# Altium footprint library TH Connectors.PcbLib: 140 footprints (part 3 of 9)
Each footprint in its own frame and in the unit in brackets; x right, y up, seen from the top. Pads: shape width x height; smd on the part's side, far side on the other; paste and mask are expansions set on the pad; w line width, h text height; cw(c..) or ccw(c..) is an arc to the next point about the centre after c.
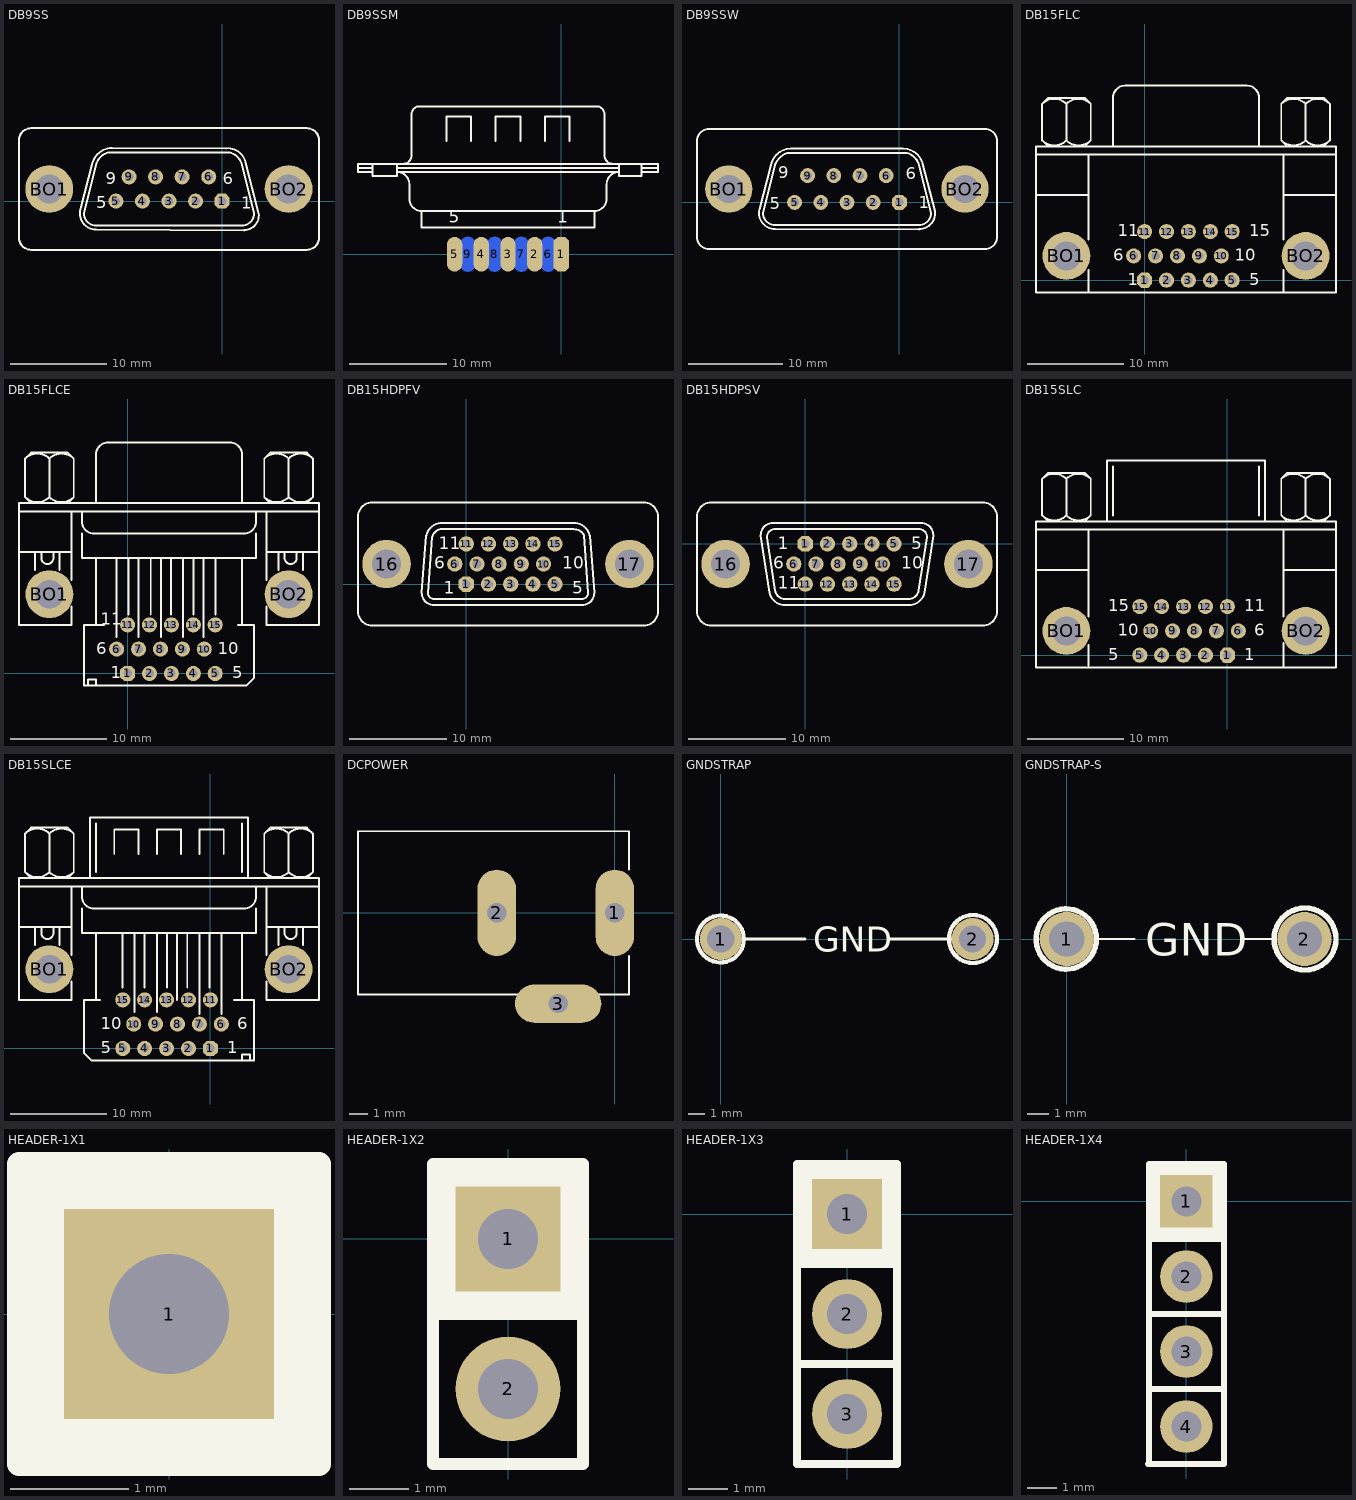
[diagram p2: the footprints below, top view; thin cyan lines are the x and y axes]

## DB9SS [mil]
pads (11):
  oct 62x62 hole 35: 1(0,0)
  round 62 hole 35: 2(-109.17,0) 3(-218.33,0) 4(-327.5,0) 5(-436.67,0) 6(-55,100) 7(-164.17,100) 8(-273.33,100) 9(-382.5,100)
  round 196.67 hole 118.33: BO1(-710.83,50) BO2(273.33,50)
Top Overlay:
  lines w8: -580,-23.33 -535,150 ; -579.7,-23.95 ccw(c-518.33,-50) -518.33,-116.67 90,-120 ; -535.1,149.55 cw(c-451.67,133.33) -451.67,218.33 15,216.67 ; -518.33,150 -568.33,-50 ccw(c-518.33,-50) -518.33,-100 81.67,-100 ccw(c81.67,-50) 131.67,-50 81.67,150 ; -517.97,149.86 cw(c-451.67,133.33) -468.2,199.64 ; -468.33,200 31.67,200 ; 15.41,217.08 cw(c23.33,141.67) 97.22,158.72 ; 31.53,199.64 cw(c15,133.33) 81.3,149.86 ; 90,-119.17 ccw(c90,-58.33) 148.48,-41.57 ; 96.67,158.33 148.33,-41.67 ; -835,-150 ccw(c-785,-150) -785,-200 348.33,-200 ccw(c348.33,-150) 398.33,-150 398.33,250 ccw(c348.33,250) 348.33,300 -785,300 ccw(c-785,250) -835,250 -835,-150
  text "6" at 1.67,70 h50
  text "1" at 78.27,-31.3 h50
  text "5" at -518.33,-30 h50
  text "9" at -478.33,70 h50

## DB9SSM [mil]
pads (9):
  oct 62.5x141.67 smd: 1(0,0)
  oval 62.5x141.67 smd: 2(-108.33,0) 3(-216.67,0) 4(-325,0) 5(-433.33,0)
  oval 62.5x141.67 smd far side: 6(-54.17,0) 7(-162.5,0) 8(-270.83,0) 9(-379.17,0)
Top Overlay:
  lines w8: -825,350 -766.67,350 ; -766.67,333.33 -825,333.33 -825,366.67 391.67,366.67 391.67,333.33 325,333.33 ; -766.67,366.67 -766.67,316.67 -666.67,316.67 -666.67,366.67 ; -666.67,350 233.33,350 ; -641.67,366.67 ccw(c-641.67,400) -608.33,400 -608.33,566.67 cw(c-575,566.67) -575,600 141.67,600 cw(c141.67,566.67) 175,566.67 175,400 ccw(c208.33,400) 208.33,366.67 ; -466.67,458.33 -466.67,558.33 -366.67,558.33 -366.67,458.33 ; -266.67,458.33 -266.67,558.33 -166.67,558.33 -166.67,458.33 ; -66.67,458.33 -66.67,558.33 33.33,558.33 33.33,458.33 ; 233.33,366.67 233.33,316.67 325,316.67 325,366.67 ; 325,350 391.67,350 ; -566.67,175 cw(c-566.67,225) -616.67,225 -616.67,283.33 ccw(c-666.67,283.33) -666.67,333.33 233.33,333.33 ccw(c233.33,283.33) 183.33,283.33 183.33,225 cw(c133.33,225) 133.33,175 ; -566.67,175 -566.67,108.33 133.33,108.33 133.33,175 ; -566.67,175 133.33,175
  text "5" at -456.67,128.33 h50
  text "1" at -16.67,128.33 h50

## DB9SSW [mil]
pads (11):
  oct 62x62 hole 35: 1(0,0)
  round 62 hole 35: 2(-109.17,0) 3(-218.33,0) 4(-327.5,0) 5(-436.67,0) 6(-55,111.67) 7(-164.17,111.67) 8(-273.33,111.67) 9(-382.5,111.67)
  round 196.67 hole 118.33: BO1(-710.83,55.83) BO2(273.33,55.83)
Top Overlay:
  lines w8: -583.33,-29.17 -535,155.83 ; -583.02,-28.04 ccw(c-518.33,-44.17) -518.33,-110.83 81.67,-112.5 ; -535.1,155.38 cw(c-451.67,139.17) -451.67,224.17 15,224.17 cw(c15,139.17) 96.29,164.02 ; -518.45,156.21 cw(c-435,122.5) -468.71,205.95 ; -518.33,155.83 -568.33,-44.17 ccw(c-518.33,-44.17) -518.33,-94.17 81.67,-94.17 ccw(c81.67,-44.17) 131.67,-44.17 81.67,155.83 ; -468.33,205.83 31.67,205.83 ; 31.53,205.47 cw(c15,139.17) 81.3,155.7 ; 81.67,-111.67 ccw(c81.67,-44.17) 148.66,-35.94 ; 96.67,162.5 148.33,-35.83 ; -843.33,-144.17 ccw(c-793.33,-144.17) -793.33,-194.17 356.67,-194.17 ccw(c356.67,-144.17) 406.67,-144.17 406.67,255.83 ccw(c356.67,255.83) 356.67,305.83 -793.33,305.83 ccw(c-793.33,255.83) -843.33,255.83 -843.33,-144.17
  text "6" at 27.27,95.73 h50
  text "1" at 81.07,-24.47 h50
  text "5" at -540.83,-29.27 h50
  text "9" at -504.43,100.53 h50

## DB15FLC [mil]
pads (17):
  oct 62x62 hole 35: 1(0,0)
  round 62 hole 35: 2(90,0) 3(180,0) 4(270,0) 5(360,0) 6(-45,100) 7(45,100) 8(135,100) 9(225,100) 10(315,100) 11(0,200) 12(90,200) 13(180,200) 14(270,200) 15(360,200)
  round 196.67 hole 118.33: BO1(-321.67,100) BO2(661.67,100)
Top Overlay:
  lines w8: -446.67,350 -230,350 ; -446.67,516.67 786.67,516.67 ; -421.75,574.91 ccw(c-371.67,625) -321.58,574.91 ; -421.75,725.09 cw(c-371.67,675) -321.58,725.09 ; -396.67,550 -421.67,575 -421.67,725 -396.67,750 -246.67,750 -221.67,725 -221.67,575 -246.67,550 ; -321.75,574.91 ccw(c-271.67,625) -221.58,574.91 ; -321.75,725.09 cw(c-271.67,675) -221.58,725.09 ; -321.67,575 -321.67,725 ; -230,-50 -230,41.67 ; -230,166.67 -230,350 ; -230,516.67 -230,350 ; -130,550 -130,750 cw(c-80,750) -80,800 420,800 cw(c420,750) 470,750 470,550 ; 561.58,574.91 ccw(c611.67,625) 661.75,574.91 ; 561.58,725.09 cw(c611.67,675) 661.75,725.09 ; 570,-50 570,41.67 ; 570,166.67 570,350 ; 570,516.67 570,350 ; 586.67,550 561.67,575 561.67,725 586.67,750 736.67,750 761.67,725 761.67,575 736.67,550 ; 661.58,574.91 ccw(c711.67,625) 761.75,574.91 ; 661.58,725.09 cw(c711.67,675) 761.75,725.09 ; 661.67,575 661.67,725 ; 786.67,350 570,350 ; -446.67,-50 786.67,-50 786.67,550 -446.67,550 -446.67,-50
  text "1" at -70,-20 h50
  text "6" at -130,80 h50
  text "11" at -110,180 h50
  text "15" at 430,180 h50
  text "10" at 370,80 h50
  text "5" at 430,-20 h50

## DB15FLCE [mil]
pads (17):
  oct 62x62 hole 35: 1(0,0)
  round 62 hole 35: 2(90,0) 3(180,0) 4(270,0) 5(360,0) 6(-45,100) 7(45,100) 8(135,100) 9(225,100) 10(315,100) 11(0,200) 12(90,200) 13(180,200) 14(270,200) 15(360,200)
  round 196.67 hole 118.33: BO1(-321.67,325.83) BO2(661.67,325.83)
Top Overlay:
  lines w8: -446.67,500 -230,500 ; -446.67,666.67 786.67,666.67 ; -421.75,724.91 ccw(c-371.67,775) -321.58,724.91 ; -421.75,883.42 cw(c-371.67,833.33) -321.58,883.42 ; -396.67,700 -421.67,725 -421.67,883.33 -396.67,908.33 -246.67,908.33 -221.67,883.33 -221.67,725 -246.67,700 ; -380,425 -380,500 ; -355,500 -355,475 ccw(c-330,475) -305,475 -305,500 ; -321.75,724.91 ccw(c-271.67,775) -221.58,724.91 ; -321.75,883.42 cw(c-271.67,833.33) -221.58,883.42 ; -321.67,725 -321.67,883.33 ; -280,425 -280,500 ; -230,275 -230,200 -446.67,200 -446.67,700 786.67,700 786.67,200 570,200 570,275 ; -230,383.33 -230,500 ; -230,666.67 -230,500 ; -188.33,575 -188.33,475 528.33,475 528.33,575 ; -188.33,666.67 -188.33,625 ccw(c-138.33,625) -138.33,575 478.33,575 ccw(c478.33,625) 528.33,625 528.33,666.67 ; -163.33,-50 -163.33,-25 -130,-25 -130,-50 ; -130,200 -130,475 ; -130,700 -130,900 cw(c-80,900) -80,950 420,950 cw(c420,900) 470,900 470,700 ; -96.67,200 -180,200 -180,-50 -146.67,-50 486.67,-50 520,-16.67 520,200 453.33,200 ; -46.67,150 -46.67,475 ; 3.33,241.67 3.33,475 ; 45,150 45,475 ; 95,241.67 95,475 ; 136.67,150 136.67,475 ; 178.33,241.67 178.33,475 ; 228.33,150 228.33,475 ; 270,241.67 270,475 ; 311.67,150 311.67,475 ; 361.67,241.67 361.67,475 ; 470,200 470,475 ; 561.58,724.91 ccw(c611.67,775) 661.75,724.91 ; 561.58,883.42 cw(c611.67,833.33) 661.75,883.42 ; 570,383.33 570,500 ; 570,666.67 570,500 ; 586.67,700 561.67,725 561.67,883.33 586.67,908.33 736.67,908.33 761.67,883.33 761.67,725 736.67,700 ; 620,425 620,500 ; 645,500 645,475 ccw(c670,475) 695,475 695,500 ; 661.58,724.91 ccw(c711.67,775) 761.75,724.91 ; 661.58,883.42 cw(c711.67,833.33) 761.75,883.42 ; 661.67,725 661.67,883.33 ; 720,425 720,500 ; 786.67,500 570,500
  text "1" at -70,-20 h50
  text "5" at 430,-20 h50
  text "10" at 370,80 h50
  text "6" at -130,80 h50
  text "11" at -110,200 h50

## DB15HDPFV [mil]
pads (17):
  oct 62x62 hole 35: 1(0,0)
  round 62 hole 35: 2(90,0) 3(180,0) 4(270,0) 5(360,0) 6(-46.67,81.67) 7(43.33,81.67) 8(133.33,81.67) 9(223.33,81.67) 10(313.33,81.67) 11(0,163.33) 12(90,163.33) 13(180,163.33) 14(270,163.33) 15(360,163.33)
  round 196.67 hole 118.33: 16(-323.33,81.67) 17(661.67,81.67)
Top Overlay:
  lines w8: -162.5,196.67 -180.83,-35 ccw(c-130.83,-35) -130.83,-85 469.17,-85 ccw(c469.17,-35) 519.17,-35 500.83,196.67 ; -162.19,197.79 cw(c-97.5,181.67) -97.5,248.33 435.83,248.33 cw(c435.83,181.67) 500.52,197.79 ; -139.17,190 -155.83,-35 ccw(c-130.83,-35) -130.83,-60 469.17,-60 ccw(c469.17,-35) 494.17,-35 477.5,198.33 ; -138.4,189.62 cw(c-97.5,181.67) -97.5,223.33 435.83,223.33 ; 440,221.66 cw(c440,180) 477.12,198.91 ; -439.17,-110 ccw(c-380.83,-110) -380.83,-168.33 719.17,-168.33 ccw(c719.17,-110) 777.5,-110 777.5,273.33 ccw(c719.17,273.33) 719.17,331.66 -380.83,331.67 ccw(c-380.83,273.33) -439.17,273.33 -439.17,-110
  text "5" at 429.17,-38.33 h50
  text "10" at 389.17,61.67 h50
  text "11" at -110.83,141.67 h50
  text "6" at -130.83,61.67 h50
  text "1" at -90.83,-38.33 h50

## DB15HDPSV [mil]
pads (17):
  oct 62x62 hole 35: 1(0,0)
  round 62 hole 35: 2(90,0) 3(180,0) 4(270,0) 5(360,0) 6(-46.67,-81.67) 7(43.33,-81.67) 8(133.33,-81.67) 9(223.33,-81.67) 10(313.33,-81.67) 11(0,-163.33) 12(90,-163.33) 13(180,-163.33) 14(270,-163.33) 15(360,-163.33)
  round 196.67 hole 118.33: 16(-323.33,-81.67) 17(661.67,-81.67)
Top Overlay:
  lines w8: -145.83,-198.33 -180.83,35 cw(c-130.83,35) -130.83,85 469.17,85 cw(c469.17,35) 519.17,35 484.17,-198.33 ; -145.52,-197.79 ccw(c-80.83,-181.67) -80.83,-248.33 419.17,-248.33 ccw(c419.17,-181.67) 483.85,-197.79 ; -122.57,-189.62 ccw(c-81.67,-181.67) -81.67,-223.33 ; -122.5,-190 -155.83,26.67 cw(c-122.5,26.67) -122.5,60 460.83,60 cw(c460.83,26.67) 494.16,26.67 459.17,-190 ; -80.83,-223.33 419.17,-223.33 ccw(c419.17,-181.67) 460.07,-189.62 ; -439.17,-273.33 ccw(c-380.83,-273.33) -380.83,-331.66 719.17,-331.67 ccw(c719.17,-273.33) 777.5,-273.33 777.5,110 ccw(c719.17,110) 719.17,168.33 -380.83,168.33 ccw(c-380.83,110) -439.17,110 -439.17,-273.33
  text "5" at 429.17,-21.67 h50
  text "10" at 389.17,-101.67 h50
  text "11" at -110.83,-181.67 h50
  text "6" at -130.83,-101.67 h50
  text "1" at -110.83,-21.67 h50

## DB15SLC [mil]
pads (17):
  oct 62x62 hole 35: 1(0,0)
  round 62 hole 35: 2(-90,0) 3(-180,0) 4(-270,0) 5(-360,0) 6(45,100) 7(-45,100) 8(-135,100) 9(-225,100) 10(-315,100) 11(0,200) 12(-90,200) 13(-180,200) 14(-270,200) 15(-360,200)
  round 196.67 hole 118.33: BO1(-661.67,100) BO2(321.67,100)
Top Overlay:
  lines w8: -786.67,350 -570,350 ; -786.67,516.67 446.67,516.67 ; -761.75,574.91 ccw(c-711.67,625) -661.58,574.91 ; -761.75,725.09 cw(c-711.67,675) -661.58,725.09 ; -736.67,550 -761.67,575 -761.67,725 -736.67,750 -586.67,750 -561.67,725 -561.67,575 -586.67,550 ; -661.75,574.91 ccw(c-611.67,625) -561.58,574.91 ; -661.75,725.09 cw(c-611.67,675) -561.58,725.09 ; -661.67,575 -661.67,725 ; -570,-41.67 -570,41.67 ; -570,158.33 -570,516.67 ; -495,550 -495,800 155,800 155,550 ; -470,575 -470,775 ; 130,575 130,775 ; 221.58,574.91 ccw(c271.67,625) 321.75,574.91 ; 221.58,725.09 cw(c271.67,675) 321.75,725.09 ; 230,-50 230,50 ; 230,158.33 230,516.67 ; 230,350 446.67,350 ; 246.67,550 221.67,575 221.67,725 246.67,750 396.67,750 421.67,725 421.67,575 396.67,550 ; 321.58,574.91 ccw(c371.67,625) 421.75,574.91 ; 321.58,725.09 cw(c371.67,675) 421.75,725.09 ; 321.67,575 321.67,725 ; -786.67,-50 -786.67,550 446.67,550 446.67,-50 -786.67,-50
  text "15" at -490,180 h50
  text "10" at -450,80 h50
  text "5" at -490,-20 h50
  text "1" at 70,-20 h50
  text "6" at 110,80 h50
  text "11" at 70,180 h50

## DB15SLCE [mil]
pads (17):
  oct 62x62 hole 35: 1(0,0)
  round 62 hole 35: 2(-90,0) 3(-180,0) 4(-270,0) 5(-360,0) 6(45,100) 7(-45,100) 8(-135,100) 9(-225,100) 10(-315,100) 11(0,200) 12(-90,200) 13(-180,200) 14(-270,200) 15(-360,200)
  round 196.67 hole 118.33: BO1(-661.67,325.83) BO2(321.67,325.83)
Top Overlay:
  lines w8: -786.67,500 -570,500 ; -786.67,666.67 446.67,666.67 ; -761.75,724.91 ccw(c-711.67,775) -661.58,724.91 ; -761.75,883.42 cw(c-711.67,833.33) -661.58,883.42 ; -736.67,700 -761.67,725 -761.67,883.33 -736.67,908.33 -586.67,908.33 -561.67,883.33 -561.67,725 -586.67,700 ; -720,425 -720,500 ; -695,500 -695,475 ccw(c-670,475) -645,475 -645,500 ; -661.75,724.91 ccw(c-611.67,775) -561.58,724.91 ; -661.75,883.42 cw(c-611.67,833.33) -561.58,883.42 ; -661.67,725 -661.67,883.33 ; -620,425 -620,500 ; -570,275 -570,200 -786.67,200 -786.67,700 446.67,700 446.67,200 230,200 230,275 ; -570,383.33 -570,500 ; -570,666.67 -570,500 ; -528.33,575 -528.33,475 188.33,475 188.33,575 ; -528.33,666.67 -528.33,625 ccw(c-478.33,625) -478.33,575 138.33,575 ccw(c138.33,625) 188.33,625 188.33,666.67 ; -495,700 -495,950 155,950 155,700 ; -470,200 -470,475 ; -470,725 -470,925 ; -453.33,200 -520,200 -520,-16.67 -486.67,-50 146.67,-50 180,-50 180,200 96.67,200 ; -395,800 -395,900 -295,900 -295,800 ; -361.67,250 -361.67,475 ; -311.67,150 -311.67,475 ; -270,250 -270,475 ; -220,150 -220,475 ; -220,800 -220,900 -120,900 -120,800 ; -178.33,250 -178.33,475 ; -136.67,200 -136.67,475 ; -95,250 -95,475 ; -45,141.67 -45,475 ; -45,800 -45,900 55,900 55,800 ; -3.33,250 -3.33,475 ; 46.67,141.67 46.67,475 ; 130,-50 130,-25 163.33,-25 163.33,-50 ; 130,200 130,475 ; 130,725 130,925 ; 221.58,724.91 ccw(c271.67,775) 321.75,724.91 ; 221.58,883.42 cw(c271.67,833.33) 321.75,883.42 ; 230,383.33 230,500 ; 230,666.67 230,500 ; 246.67,700 221.67,725 221.67,883.33 246.67,908.33 396.67,908.33 421.67,883.33 421.67,725 396.67,700 ; 280,425 280,500 ; 305,500 305,475 ccw(c330,475) 355,475 355,500 ; 321.58,724.91 ccw(c371.67,775) 421.75,724.91 ; 321.58,883.42 cw(c371.67,833.33) 421.75,883.42 ; 321.67,725 321.67,883.33 ; 380,425 380,500 ; 446.67,500 230,500
  text "1" at 70,-20 h50
  text "10" at -450,80 h50
  text "5" at -450,-20 h50
  text "6" at 110,80 h50

## DCPOWER [mil]
pads (3):
  oval 80x180 hole 40: 1(0,0) 2(-246,0)
  oval 180x80 hole 40: 3(-118,-189)
Top Overlay:
  lines w4: -199,-170 -535,-170 -535,170 30,170 30,90 ; -37,-170 30,-170 30,-90
Mechanical 1:
  lines w4: -265,-51 -265,49 ; -265,-50 ccw(c-245,-50) -225,-50 ; -265,50 cw(c-245,50) -225,50 ; -225,-51 -225,49 ; -168,-208 cw(c-168,-188) -168,-168 ; -167,-208 -67,-208 ; -167,-168 -67,-168 ; -68,-208 ccw(c-68,-188) -68,-168 ; -19,-51 -19,49 ; -19,-50 ccw(c1,-50) 21,-50 ; -19,50 cw(c1,50) 21,50 ; 21,-51 21,49
  text "Milled holes" at -521,122 h35
  text "120X40" at -213,-302 h35
  text "140X40" at 133,-98 h35
  text "140X40" at -292,-101 h35

## GNDSTRAP [mil]
pads (2):
  round 100 hole 65: 1(0,0) 2(600,0)
Top Overlay:
  circle w10: c601,0 r57.31
  circle w10: c-1,0 r55.9
  lines w8: 50,0 200,0 ; 400,0 550,0
  text "GND" at 220,-30 h60
3D body: height 150, standoff -100, extent -30,-29.5 29.76,30.38
3D body: height 150, standoff -100, extent 570.5,-30 630.26,29.88
3D body: height 180, standoff 120, extent 570.54,-30 630.23,29.74
3D body: height 180, standoff 120, extent -30,-29.42 29.69,30.32
3D body: height 179.94, standoff 120.06, extent 0.39,-30 600.39,29.76

## GNDSTRAP-S [mil]
pads (2):
  round 100 hole 65: 1(0,0) 2(440,0)
Top Overlay:
  circle w10: c-1,0 r55.9
  circle w10: c441,0 r57.31
  lines w4: 54.9,0 125,0 ; 324,0 382,0 383,-1
  text "GND" at 145,-31 h60
3D body: height 150, standoff -100, extent -30,-29.5 29.76,30.38
3D body: height 150, standoff -100, extent 409.5,-30 469.26,29.88
3D body: height 180, standoff 120, extent 409.54,-30 469.23,29.74
3D body: height 180, standoff 120, extent -30,-29.42 29.69,30.32
3D body: height 179.94, standoff 120.06, extent 0.39,-30 440.39,29.76

## HEADER-1X1 [mil]
pads (1):
  rect 70x70 hole 40: 1(0,0)
Top Overlay:
  rectangle: -50,-49.62 50,50
  lines w8: -50,-50 50,-50 ; -50,-50 50,-50 ; -50,-50 -50,50 50,50 50,-50
3D body: height 101, standoff 100, extent -35,-35 35.5,35
3D body: height 470, standoff -120, extent -15,-15 15,15
3D body: height 100, standoff 0, extent -50,-49.5 50,50

## HEADER-1X2 [mil]
pads (2):
  rect 70x70 hole 40: 1(0,0)
  round 70 hole 40: 2(0,-100)
Top Overlay:
  rectangle: -50,-49.62 50,50
  lines w8: -50,-50 50,-50 ; -50,-150 50,-150 50,50 -50,50 -50,-150
3D body: height 101, standoff 100, extent -35,-35 35.5,35
3D body: height 470, standoff -120, extent -15,-15 15,15
3D body: height 470, standoff -120, extent -15,-115 15,-85
3D body: height 100, standoff 0, extent -50,-150 50,50

## HEADER-1X3 [mil]
pads (3):
  rect 70x70 hole 40: 1(0,0)
  round 70 hole 40: 2(0,-100) 3(0,-200)
Top Overlay:
  rectangle: -50,-49.62 50,50
  lines w8: -50,-150 50,-150 ; -50,-50 50,-50 ; -50,-250 50,-250 ; -50,-250 50,-250 ; -50,-250 -50,50 50,50 50,-250
3D body: height 101, standoff 100, extent -35,-35 35.5,35
3D body: height 470, standoff -120, extent -15,-15 15,15
3D body: height 470, standoff -120, extent -15,-115 15,-85
3D body: height 100, standoff 0, extent -50,-250 50,50
3D body: height 470, standoff -120, extent -15,-215 15,-185

## HEADER-1X4 [mil]
pads (4):
  rect 70x70 hole 40: 1(0,0)
  round 70 hole 40: 2(0,-100) 3(0,-200) 4(0,-300)
Top Overlay:
  rectangle: -50,-49.62 50,50
  lines w8: -51,-350 49,-350 ; -50,-250 50,-250 ; -50,-150 50,-150 ; -50,-50 50,-50 ; -50,-350 -50,50 50,50 50,-350 ; -50,-350 50,-350 ; -50,-350 50,-350
3D body: height 470, standoff -120, extent -15,-215 15,-185
3D body: height 100, standoff 0, extent -50,-350 50,50
3D body: height 470, standoff -120, extent -15,-115 15,-85
3D body: height 470, standoff -120, extent -15,-15 15,15
3D body: height 470, standoff -120, extent -15,-315 15,-285
3D body: height 101, standoff 100, extent -35,-35 35.5,35